# Altium footprint library AltiumDesignerLibraries.PcbLib: 313 footprints (part 3 of 20)
Each footprint in its own frame and in the unit in brackets; x right, y up, seen from the top. Pads: shape width x height; smd on the part's side, far side on the other; paste and mask are expansions set on the pad; w line width, h text height; cw(c..) or ccw(c..) is an arc to the next point about the centre after c.
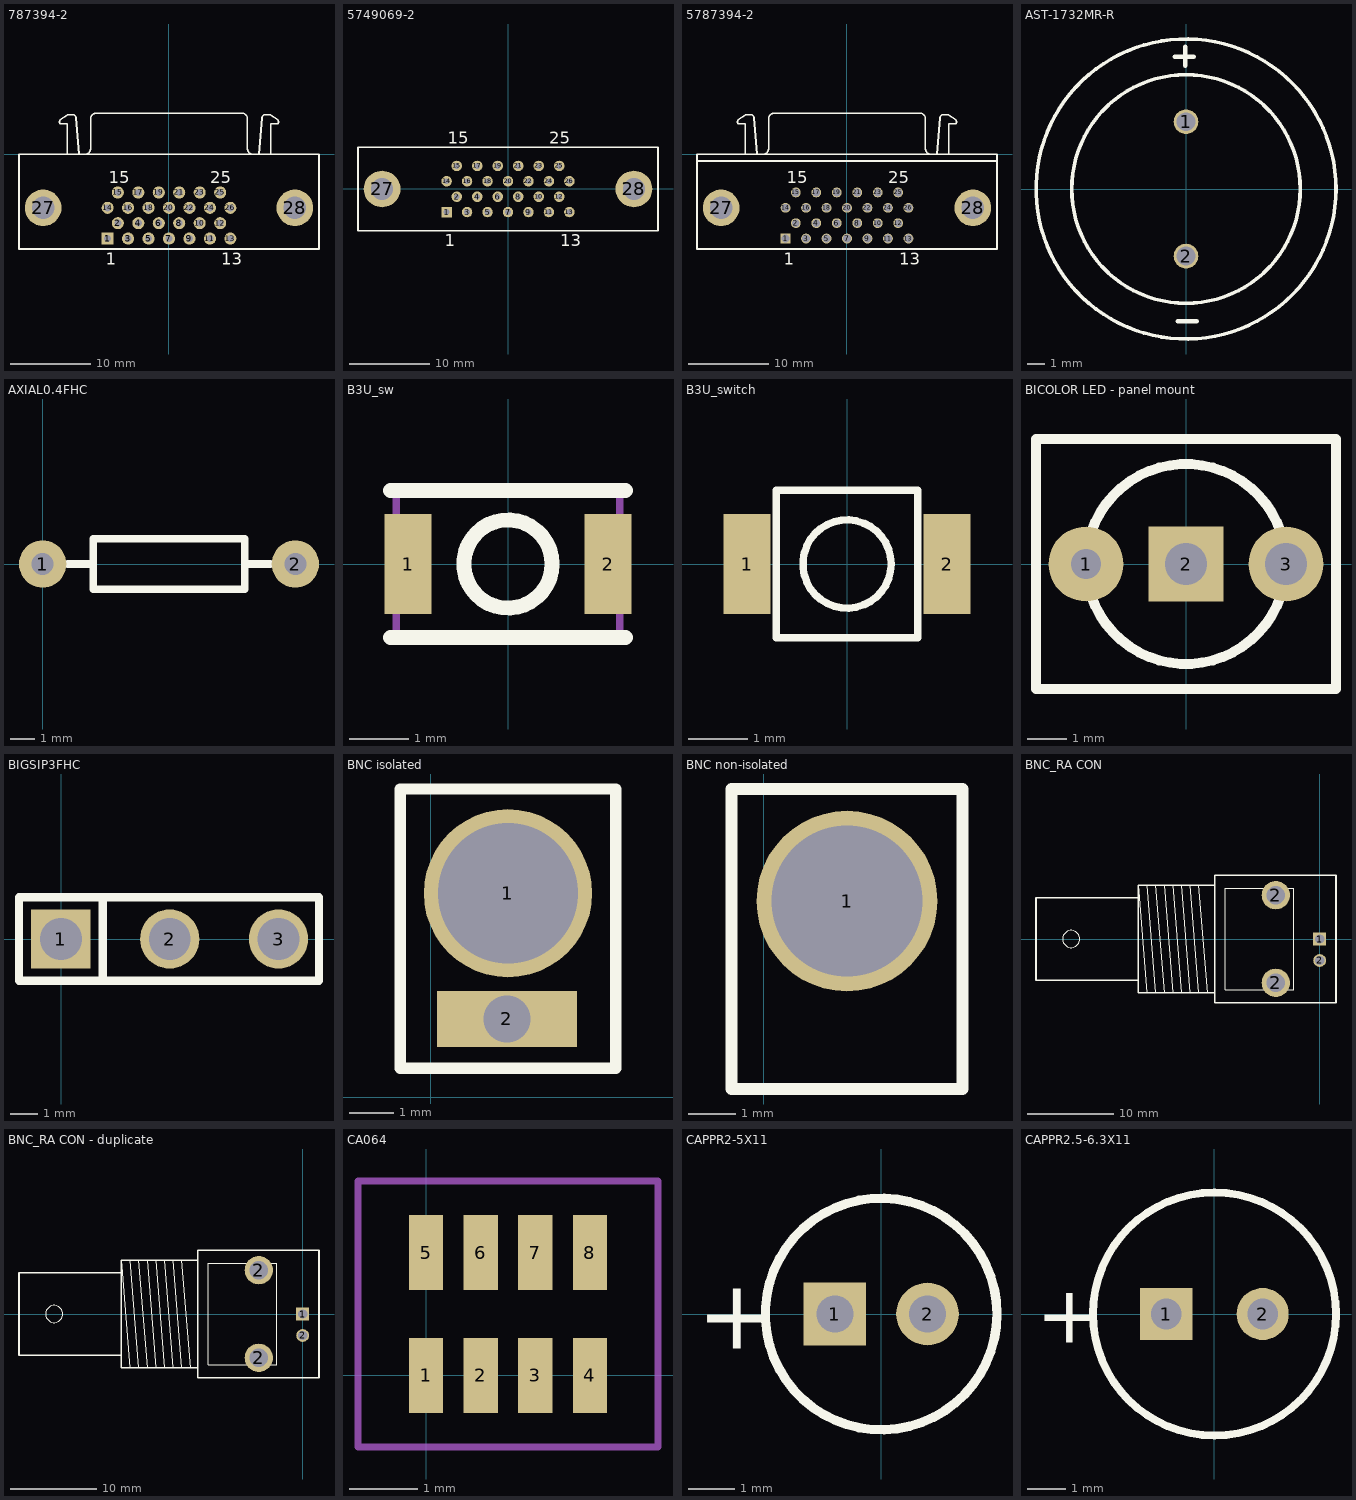
[diagram p2: the footprints below, top view; thin cyan lines are the x and y axes]

## 787394-2 [mm]
pads (28):
  rect 1.5x1.5 hole 0.86: 1(-7.62,-10.46)
  round 1.5 hole 0.86: 2(-6.35,-8.555) 3(-5.08,-10.46) 4(-3.81,-8.555) 5(-2.54,-10.46) 6(-1.27,-8.555) 7(0,-10.46) 8(1.27,-8.555) 9(2.54,-10.46) 10(3.81,-8.555) 11(5.08,-10.46) 12(6.35,-8.555) 13(7.62,-10.46) 14(-7.62,-6.65) 15(-6.35,-4.745) 16(-5.08,-6.65) 17(-3.81,-4.745) 18(-2.54,-6.65) 19(-1.27,-4.745) 20(0,-6.65) 21(1.27,-4.745) 22(2.54,-6.65) 23(3.81,-4.745) 24(5.08,-6.65) 25(6.35,-4.745) 26(7.62,-6.65)
  round 4.55 hole 2.77: 27(-15.62,-6.65) 28(15.62,-6.65)
Top Overlay:
  lines w0.2: -13.505,4.27 -12.565,4.898 -11.843,4.898 cw(c-11.945,4.5) -11.535,4.5 ; -13.491,4.255 ccw(c-13.265,4.01) -13.515,3.79 -12.635,3.79 -12.635,0 ; -11.535,4.52 -11.165,0 ; -10.425,0.005 ccw(c-10.425,0.7) -9.73,0.7 -9.73,4.4 cw(c-9.035,4.4) -9.035,5.095 ; -9.035,5.11 9.035,5.11 ; 9.035,5.105 cw(c9.035,4.41) 9.73,4.41 9.73,0.7 ccw(c10.425,0.7) 10.425,0.005 ; 11.165,0 11.535,4.52 ; 11.535,4.5 cw(c11.945,4.5) 11.843,4.898 12.565,4.898 13.505,4.27 ; 12.635,0 12.635,3.79 13.515,3.79 ccw(c13.265,4.01) 13.491,4.255 ; -18.615,-11.76 18.615,-11.76 18.615,0 -18.615,0 -18.615,-11.76
  text "1" at -7.87,-13.735 h1.5
  text "13" at 6.495,-13.735 h1.5
  text "15" at -7.475,-3.62 h1.5
  text "25" at 5.1,-3.62 h1.5

## 5749069-2 [mil] "Vertical mini-D 26 position"
pads (28):
  rect 51.22x51.22 hole 27.6: 1(-300,-112.5)
  round 51.22 hole 27.6: 2(-250,-37.5) 3(-200,-112.5) 4(-150,-37.5) 5(-100,-112.5) 6(-50,-37.5) 7(0,-112.5) 8(50,-37.5) 9(100,-112.5) 10(150,-37.5) 11(200,-112.5) 12(250,-37.5) 13(300,-112.5) 14(-300,37.5) 15(-250,112.5) 16(-200,37.5) 17(-150,112.5) 18(-100,37.5) 19(-50,112.5) 20(0,37.5) 21(50,112.5) 22(100,37.5) 23(150,112.5) 24(200,37.5) 25(250,112.5) 26(300,37.5)
  round 179.13 hole 109.06: 27(-614.96,0) 28(614.96,0)
Top Overlay:
  lines w7.87: -732.48,-202.95 -732.48,202.95 732.48,202.95 732.48,-202.95 -732.48,-202.95
  text "25" at 200.79,221.65 h59.06
  text "15" at -294.29,221.65 h59.06
  text "13" at 255.71,-280.71 h59.06
  text "1" at -309.84,-280.71 h59.06

## 5787394-2 [mil] "Female 26 pos. mini-D receptacle"
pads (28):
  rect 48x48 hole 38: 1(-300,-411.81)
  round 48 hole 38: 2(-250,-336.81) 3(-200,-411.81) 4(-150,-336.81) 5(-100,-411.81) 6(-50,-336.81) 7(0,-411.81) 8(50,-336.81) 9(100,-411.81) 10(150,-336.81) 11(200,-411.81) 12(250,-336.81) 13(300,-411.81) 14(-300,-261.81) 15(-250,-186.81) 16(-200,-261.81) 17(-150,-186.81) 18(-100,-261.81) 19(-50,-186.81) 20(0,-261.81) 21(50,-186.81) 22(100,-261.81) 23(150,-186.81) 24(200,-261.81) 25(250,-186.81) 26(300,-261.81)
  round 179.13 hole 109.06: 27(-614.96,-261.81) 28(614.96,-261.81)
Top Overlay:
  lines w7.87: -732.87,-33.07 732.87,-33.07 ; -531.69,168.11 -494.69,192.82 -466.25,192.82 cw(c-470.28,177.17) -454.11,177.17 ; -531.14,167.51 ccw(c-522.24,157.87) -532.09,149.21 -497.44,149.21 -497.44,0 ; -454.13,177.95 -439.57,0 ; -410.43,0.2 ccw(c-410.43,27.56) -383.07,27.56 -383.07,173.23 cw(c-355.71,173.23) -355.71,200.59 ; -355.71,201.18 355.71,201.18 ; 355.71,200.98 cw(c355.71,173.62) 383.07,173.62 383.07,27.56 ccw(c410.43,27.56) 410.43,0.2 ; 439.57,0 454.13,177.95 ; 454.11,177.17 cw(c470.28,177.17) 466.25,192.82 494.69,192.82 531.69,168.11 ; 497.44,0 497.44,149.21 532.09,149.21 ccw(c522.24,157.87) 531.14,167.51 ; -732.87,-462.99 732.87,-462.99 732.87,0 -732.87,0 -732.87,-462.99
  text "1" at -309.84,-540.75 h59.06
  text "13" at 255.71,-540.75 h59.06
  text "15" at -294.29,-142.52 h59.06
  text "25" at 200.79,-142.52 h59.06

## AST-1732MR-R [mm]
pads (2):
  round 1.4 hole 1.067: 1(0,3.81) 2(0,-3.8)
Top Overlay:
  circle w0.203: c0,0 r8.5
  circle w0.203: c0,0 r6.477
  lines w0.254: -0.625,7.5 0.45,7.5 ; -0.475,-7.5 0.6,-7.5 ; -0.05,6.975 -0.05,8.05

## AXIAL0.4FHC [mil]
pads (2):
  round 75 hole 35: 1(0.25,0) 2(400.25,0)
Top Overlay:
  lines w12: 40.25,0 80.25,0 ; 320.25,0 360.25,0 ; 80.25,-40 320.25,-40 320.25,40 80.25,40 80.25,-40

## B3U_sw [mm] "Tactile reset switch footprint"
height 1.6
pads (2):
  rect 0.8x1.7 smd: 1(-1.7,0) 2(1.7,0)
Top Overlay:
  circle w0.254: c0,0 r0.75
  lines w0.254: -2,-1.25 2,-1.25 ; -2,1.25 2,1.25
Mechanical 12:
  circle w0.12: c0,0 r0.75
  lines w0.12: -1.9,-1.25 1.9,-1.25 1.9,1.25 -1.9,1.25 -1.9,-1.25
3D body: height 1.2, standoff 0, extent -1.9,-1.377 1.9,1.377
3D body: height 1.2, standoff 0, extent -1.999,-1.249 1.999,1.249
3D body: height 1.6, standoff 0, extent -0.756,-0.756 0.756,0.756

## B3U_switch [mm]
height 1.575
pads (2):
  rect 0.8x1.7 smd: 1(-1.7,0) 2(1.7,0)
Top Overlay:
  circle w0.127: c0,0 r0.75
  lines w0.127: -1.2,-1.25 1.2,-1.25 1.2,1.25 -1.2,1.25 -1.2,-1.25
3D body: height 1.6, standoff 0, extent -0.744,-0.748 0.75,0.749
3D body: height 1.2, standoff 0, extent -1.2,-1.25 1.25,1.25

## BICOLOR LED - panel mount [mil]
pads (3):
  round 75 hole 30: 1(-100,0)
  rect 75x75 hole 42: 2(0,0)
  round 75 hole 42: 3(100,0)
Top Overlay:
  circle w10: c0,0 r100
  lines w10: -150,-125 -150,125 125,125 150,125 150,-125 -150,-125

## BIGSIP3FHC [mil]
pads (3):
  rect 85x85 hole 60: 1(-0.38,0)
  round 85 hole 60: 2(155.62,0) 3(311.62,0)
Top Overlay:
  lines w12: 59.62,-60 59.62,60 ; -60.38,-60 -60.38,60 369.62,60 369.62,-60 -60.38,-60

## BNC isolated [mil]
pads (2):
  round 150 hole 125: 1(69,182)
  rect 125x50 hole 42: 2(68,70)
Top Overlay:
  lines w10: -27,26 -27,252 -27,275 165,275 165,26 158,26 -27,26

## BNC non-isolated [mil]
pads (1):
  round 150 hole 125: 1(69,182)
Top Overlay:
  lines w10: -27,26 158,26 165,26 165,275 -27,275 -27,252 -27,26

## BNC_RA CON [mm]
pads (4):
  rect 1.5x1.5 hole 1.067: 1(0,0)
  round 3.3 hole 2.184: 2(-5.1,-5.1) 2(-5.1,5.1)
  round 1.5 hole 1.067: 2(0,-2.5)
Top Overlay:
  circle w0.025: c-28.9,0 r1
  lines w0.025: -20.1,-6.25 -21.1,6.25 ; -20.1,6.25 -19.1,-6.25 ; -19.1,6.25 -18.1,-6.25 ; -18.1,6.25 -17.1,-6.25 ; -17.1,6.25 -16.1,-6.25 ; -16.1,6.25 -15.1,-6.25 ; -15.1,6.25 -14.1,-6.25 ; -14.1,6.25 -13.1,-6.25 ; -21.1,-4.8 -33,-4.8 -33,4.8 -21.1,4.8 ; -21.1,-4.8 -21.1,4.8 ; -21.1,-4.8 -21.1,-6.25 -12.2,-6.25 ; -21.1,4.8 -21.1,6.25 ; -21.1,6.25 -12.2,6.25 ; -12.2,-6.25 -12.2,6.25 ; -12.2,-6.25 -12.2,-7.4 1.9,-7.4 1.9,7.4 -12.2,7.4 -12.2,6.25 ; -11,-5.9 -3,-5.9 -3,5.9 -11,5.9 -11,-5.9
  lines w0.2: -21.1,-4.8 -21.1,4.8 ; -21.1,-4.8 -33,-4.8 -33,4.8 -21.1,4.8 ; -21.1,-4.8 -21.1,-6.25 -12.2,-6.25 ; -21.1,4.8 -21.1,6.25 -12.2,6.25 ; -12.2,-6.25 -12.2,6.25 ; -12.2,-6.25 -12.2,-7.4 1.9,-7.4 1.9,7.4 -12.2,7.4 -12.2,6.25

## BNC_RA CON - duplicate [mm]
pads (4):
  rect 1.5x1.5 hole 1.067: 1(0,0)
  round 3.3 hole 2.184: 2(-5.1,-5.1) 2(-5.1,5.1)
  round 1.5 hole 1.067: 2(0,-2.5)
Top Overlay:
  circle w0.025: c-28.9,0 r1
  lines w0.025: -20.1,-6.25 -21.1,6.25 ; -20.1,6.25 -19.1,-6.25 ; -19.1,6.25 -18.1,-6.25 ; -18.1,6.25 -17.1,-6.25 ; -17.1,6.25 -16.1,-6.25 ; -16.1,6.25 -15.1,-6.25 ; -15.1,6.25 -14.1,-6.25 ; -14.1,6.25 -13.1,-6.25 ; -21.1,-4.8 -21.1,-6.25 -12.2,-6.25 ; -21.1,-4.8 -21.1,4.8 ; -21.1,-4.8 -33,-4.8 -33,4.8 -21.1,4.8 ; -21.1,4.8 -21.1,6.25 ; -21.1,6.25 -12.2,6.25 ; -12.2,-6.25 -12.2,-7.4 1.9,-7.4 1.9,7.4 -12.2,7.4 -12.2,6.25 ; -12.2,-6.25 -12.2,6.25 ; -11,-5.9 -11,5.9 -3,5.9 -3,-5.9 -11,-5.9
  lines w0.2: -21.1,-4.8 -21.1,-6.25 -12.2,-6.25 ; -21.1,-4.8 -33,-4.8 -33,4.8 -21.1,4.8 ; -21.1,-4.8 -21.1,4.8 ; -21.1,4.8 -21.1,6.25 -12.2,6.25 ; -12.2,-6.25 -12.2,-7.4 1.9,-7.4 1.9,7.4 -12.2,7.4 -12.2,6.25 ; -12.2,-6.25 -12.2,6.25

## CA064 [mm] "CA064 Capacitor Array Foootprint"
pads (8):
  rect 0.5x1.1 smd: 1(0,0) 2(0.8,0) 3(1.6,0) 4(2.4,0) 5(0,1.8) 6(0.8,1.8) 7(1.6,1.8) 8(2.4,1.8)
Mechanical 15:
  lines w0.1: -1,-1.05 -1,2.85 3.4,2.85 3.4,-1.05 -1,-1.05

## CAPPR2-5X11 [mm]
height 11
pads (2):
  rect 1.35x1.35 hole 0.8: 1(-1,0)
  round 1.35 hole 0.8: 2(1,0)
Top Overlay:
  circle w0.2: c0,0 r2.5
  text "+" at -3.975,-0.75 h1.5

## CAPPR2.5-6.3X11 [mm]
height 11
pads (2):
  rect 1.35x1.35 hole 0.8: 1(-1.25,0)
  round 1.35 hole 0.8: 2(1.25,0)
Top Overlay:
  circle w0.2: c0,0 r3.15
  text "+" at -4.625,-0.75 h1.5